# Altium integrated library Mastermind.IntLib: 985 symbols (part 2 of 6) (continued)
## F15HDH (continued)
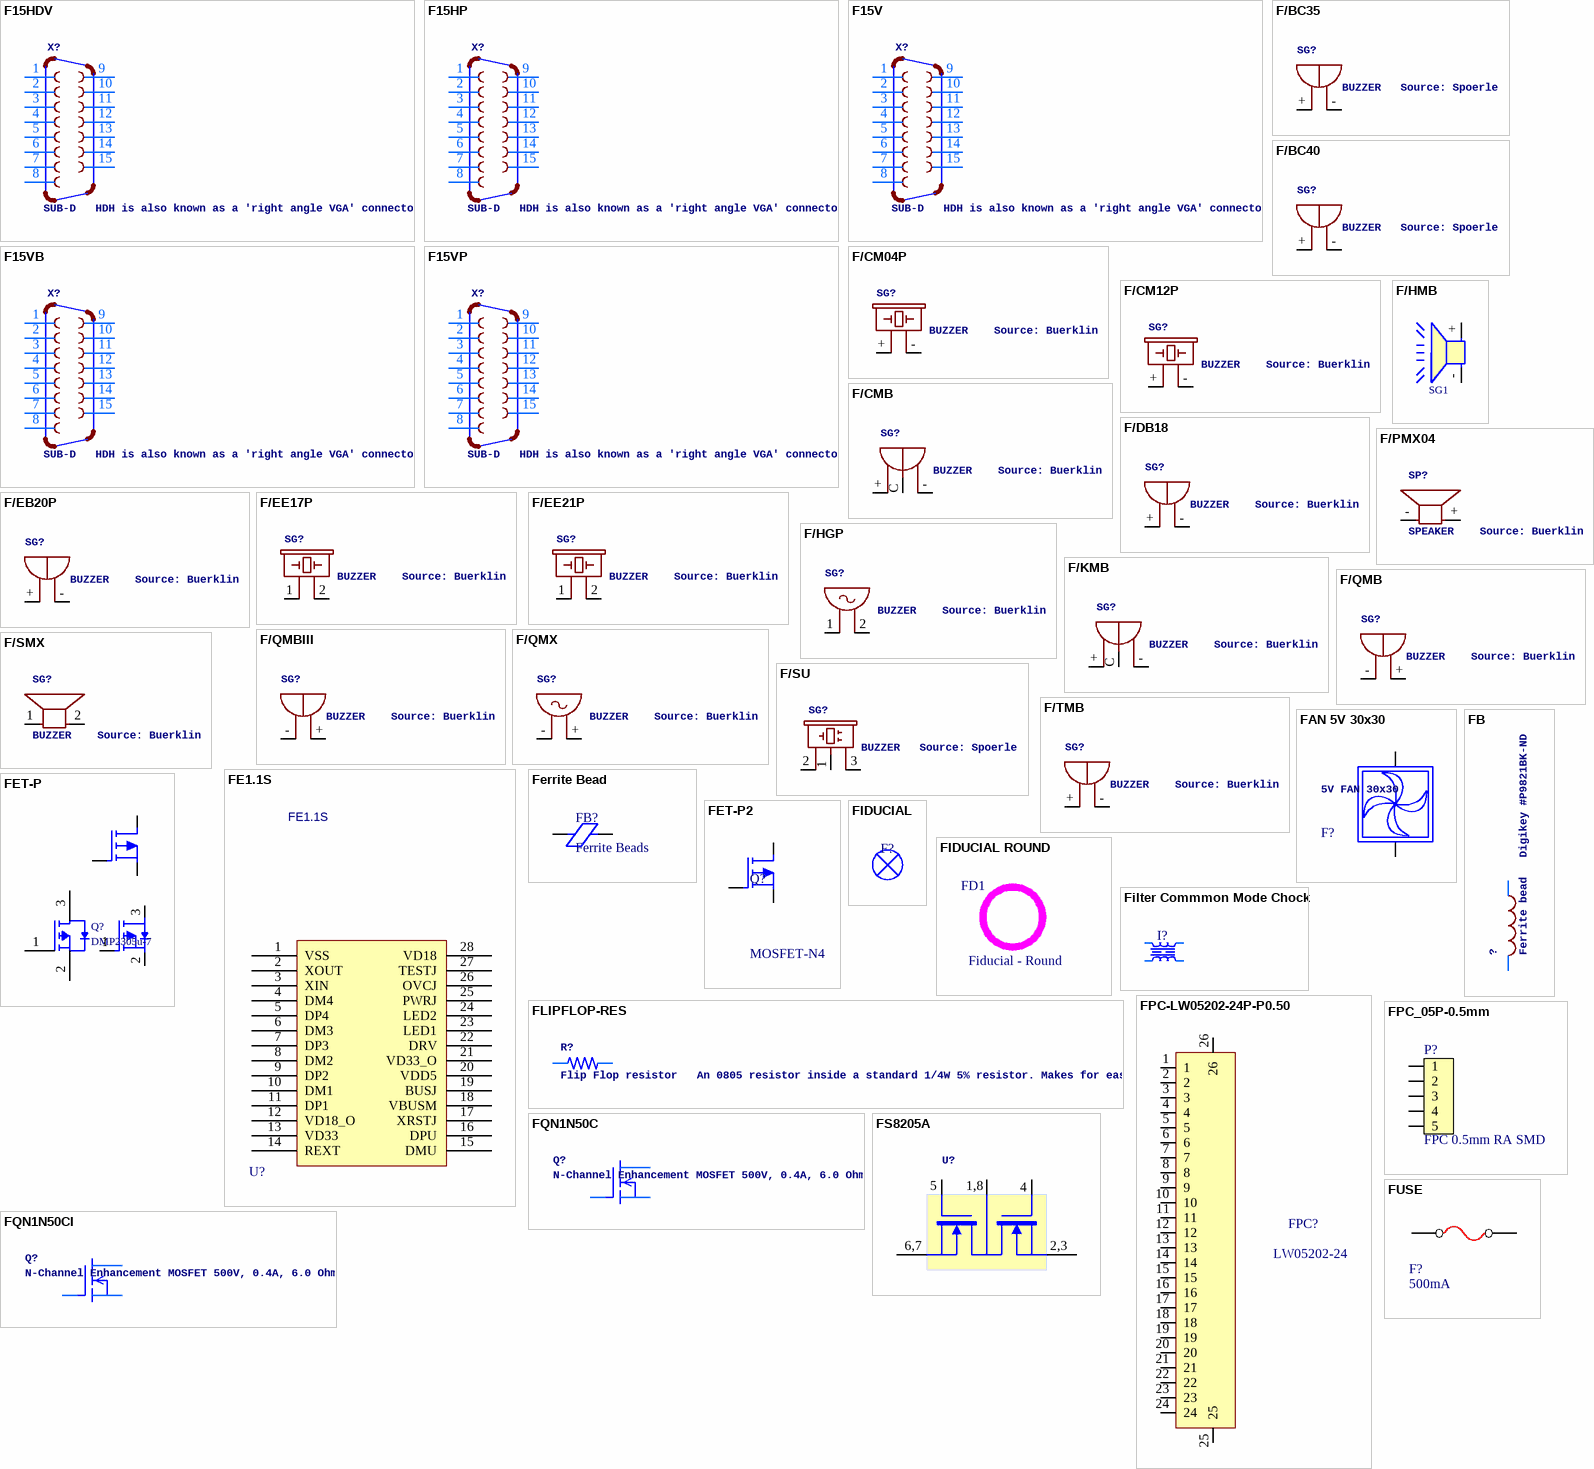
[diagram p12: symbols F15HDV to FUSE]

## F15HDV
designator X?, comment SUB-D   HDH is also known as a 'right angle VGA' connector
footprint HDF15V
pins: 1, 2, 3, 4, 5, 6, 7, 8, 9, 10, 11, 12, 13, 14, 15

## F15HP
designator X?, comment SUB-D   HDH is also known as a 'right angle VGA' connector
footprint F15HP
pins: 1, 2, 3, 4, 5, 6, 7, 8, 9, 10, 11, 12, 13, 14, 15

## F15V
designator X?, comment SUB-D   HDH is also known as a 'right angle VGA' connector
footprint F15V
pins: 1, 2, 3, 4, 5, 6, 7, 8, 9, 10, 11, 12, 13, 14, 15

## F15VB
designator X?, comment SUB-D   HDH is also known as a 'right angle VGA' connector
footprint F15VB
pins: 1, 2, 3, 4, 5, 6, 7, 8, 9, 10, 11, 12, 13, 14, 15

## F15VP
designator X?, comment SUB-D   HDH is also known as a 'right angle VGA' connector
footprint F15VP
pins: 1, 2, 3, 4, 5, 6, 7, 8, 9, 10, 11, 12, 13, 14, 15

## F/BC35
designator SG?, comment BUZZER   Source: Spoerle
OC_FARNELL: unknown; OC_NEWARK: unknown
footprint F/BC35
pins: +, -

## F/BC40
designator SG?, comment BUZZER   Source: Spoerle
OC_FARNELL: unknown; OC_NEWARK: unknown
footprint F/BC40
pins: +, -

## F/CM04P
designator SG?, comment BUZZER    Source: Buerklin
OC_FARNELL: unknown; OC_NEWARK: unknown
footprint F/CM04P
pins: + 1, - 2

## F/CM12P
designator SG?, comment BUZZER    Source: Buerklin
OC_FARNELL: unknown; OC_NEWARK: unknown
footprint F/CM12P
pins: + 1, - 2

## F/CMB
designator SG?, comment BUZZER    Source: Buerklin
OC_FARNELL: unknown; OC_NEWARK: unknown
footprint F/CMB
pins: +, -, C T

## F/DB18
designator SG?, comment BUZZER    Source: Buerklin
OC_FARNELL: unknown; OC_NEWARK: unknown
footprint F/DB18
pins: +, -

## F/EB20P
designator SG?, comment BUZZER    Source: Buerklin
OC_FARNELL: unknown; OC_NEWARK: unknown
footprint F/EB20P
pins: +, -

## F/EE17P
designator SG?, comment BUZZER    Source: Buerklin
OC_FARNELL: unknown; OC_NEWARK: unknown
footprint F/EE17P
pins: 1, 2

## F/EE21P
designator SG?, comment BUZZER    Source: Buerklin
OC_FARNELL: unknown; OC_NEWARK: unknown
footprint F/EE21P
pins: 1, 2

## F/HGP
designator SG?, comment BUZZER    Source: Buerklin
OC_FARNELL: unknown; OC_NEWARK: unknown
footprint F/HGP
pins: 1, 2

## F/HMB
designator SG1, comment YHE12-05ST  (value not drawn)
BUZZER; OC_FARNELL: unknown; OC_NEWARK: unknown
footprint F/HMB
pins: + 2, - 1

## F/KMB
designator SG?, comment BUZZER    Source: Buerklin
OC_FARNELL: unknown; OC_NEWARK: unknown
footprint F/KMB
pins: +, -, C T

## F/PMX04
designator SP?, comment SPEAKER    Source: Buerklin
OC_FARNELL: unknown; OC_NEWARK: unknown
footprint F/PMX04A
pins: + 2, - 1

## F/QMB
designator SG?, comment BUZZER    Source: Buerklin
OC_FARNELL: unknown; OC_NEWARK: unknown
footprint F/QMB
pins: + -, - +

## F/QMBIII
designator SG?, comment BUZZER    Source: Buerklin
OC_FARNELL: unknown; OC_NEWARK: unknown
footprint F/QMBIII
pins: + -, - +

## F/QMX
designator SG?, comment BUZZER    Source: Buerklin
OC_FARNELL: unknown; OC_NEWARK: unknown
footprint F/QMX
pins: + 2, - 1

## F/SMX
designator SG?, comment BUZZER    Source: Buerklin
OC_FARNELL: unknown; OC_NEWARK: unknown
footprint F/SMX
pins: 1, 2

## F/SU
designator SG?, comment BUZZER   Source: Spoerle
OC_FARNELL: unknown; OC_NEWARK: unknown
footprint F/SU
pins: 1, 2, 3

## F/TMB
designator SG?, comment BUZZER    Source: Buerklin
OC_FARNELL: unknown; OC_NEWARK: unknown
footprint F/TMB
pins: +, -

## FAN 5V 30x30
designator F?, comment 5V FAN 30x30
RaspberryPi Fan 5V 30x30
footprint JST-2-PTH-THM - VERTICAL
pins: 1, 2

## FB
designator ?, comment Ferrite bead   Digikey #P9821BK-ND
footprint FB
pins: P$1 1, P$2 2

## FE1.1S
designator U?
USB HUB 2.0, 4 Channel; Manufacturer: TERMINUS; Manufacturer Part: FE1.1S-BSOP28BCN; Supplier: LCSC; Supplier Part: C9359; JLCPCB Part Class: Extended Part; link: https://lcsc.com/eda_search?q=C9359&%26type=1&ref=editor; spicePre: U; spiceSymbolName: FE1.1S
footprint SSOP-28_L9.9-W3.9-P0.64-LS6.0-BL-1
pins: 1 VSS, 2 XOUT, 3 XIN, 4 DM4, 5 DP4, 6 DM3, 7 DP3, 8 DM2, 9 DP2, 10 DM1, 11 DP1, 12 VD18_O, 13 VD33, 14 REXT, 15 DMU, 16 DPU, 17 XRSTJ, 18 VBUSM, 19 BUSJ, 20 VDD5, 21 VD33_O, 22 DRV, 23 LED1, 24 LED2, 25 PWRJ, 26 OVCJ, 27 TESTJ, 28 VD18

## Ferrite Bead
designator FB?, comment Ferrite Beads
footprint INDC-0805
footprint INDC1005X04L
footprint INDC1608X06L
footprint INDC-0603
footprint INDC-0402
footprint INDC-0805-NO
pins: 1, 2

## FET-P
designator Q?, comment DMP2305u-7
P Channel Mosfet
pins: 1 "Gate", 1 G, 1 G, 2 "Source", 2 S, 2 D, 3 "Drain", 3 D, 4 S

## FET-P2
designator Q?, comment MOSFET-N4
N-Channel MOSFET, Externally Terminated Substrate; Published: 24-Mar-1999; LatestRevisionDate: 29-May-2009; LatestRevisionNote: IPC-7351 Footprint Added.; PackageVersion: Sep-2000; PackageReference: SOT-343; Publisher: Altium Limited; PackageDescription: 4-Pin SOT-343 Package 1.3 mm Pitch, 2.1 mm Lead Span
footprint SOT-343_N (SOT343, 4-Leads, Body 2x1.3 mm, Pitch 1.3mm, Lead Span 2.1mm, IPC Medium Density)
footprint SOT-343_L (SOT343, 4-Leads, Body 2x1.3 mm, Pitch 1.3mm, Lead Span 2.1mm, IPC High Density)
footprint SOT-343_M (SOT343, 4-Leads, Body 2x1.3 mm, Pitch 1.3mm, Lead Span 2.1mm, IPC Low Density)
simulation model NMOS (MOSFET-N)
pins: 1 G, 2 D, 4 S

## FIDUCIAL
designator F?, comment For use by pick and place machines to calibrate the vision/machine, 1mm  (value not drawn)
Fiducial Mark
footprint FIDUCIAL_1MM
footprint Fiducial

## FIDUCIAL ROUND
designator FD1, comment Fiducial - Round
Fiducial - Round 1.5mm Top-Bottom; Status: Unreleased; Category: Fiducial
footprint Fiducial

## Filter Commmon Mode Chock
designator I?  (value not drawn)
footprint filter
pins: 1, 2, 3 2, 4 3

## FLIPFLOP-RES
designator R?, comment Flip Flop resistor   An 0805 resistor inside a standard 1/4W 5% resistor. Makes for easy mods
footprint 0805-THM
pins: 1, 2

## FPC-LW05202-24P-P0.50
designator FPC?, comment LW05202-24
Manufacturer: MINTRON(明硕); Add into BOM: yes; Locking Feature: 抽屉式; Number of Contacts: 24P; Pitch: 0.5mm; FFC, FCB Thickness: 0.3mm; Symbol: LW05202-24; Device: LW05202-24; LCSC Part Name: 间距:0.5mm P数:24P 抽屉式 下接; Supplier Part: C375920; Manufacturer Part: LW05202-24; Supplier Footprint: SMD,P=0.5mm,卧贴; JLCPCB Part Class: Extended Part; Datasheet: https://atta.szlcsc.com/upload/public/pdf/source/20190322/C375926_97FD0B8889EE24B4FE9B3A29C1023ADE.pdf; Supplier: LCSC; Convert to PCB: yes; Contact Type: Bottom Contact; Mounting Type: 卧贴; Height Above Board: 2mm
footprint FPC-SMD_24P-P0.50_LW05202-24
3D model FPC-SMD_24P-P0.50_L17.6-W5.2-H2.0-LW05202-24
pins: 1, 2, 3, 4, 5, 6, 7, 8, 9, 10, 11, 12, 13, 14, 15, 16, 17, 18, 19, 20, 21, 22, 23, 24, 25, 26

## FPC_05P-0.5mm
designator P?, comment FPC 0.5mm RA SMD
0.5mm FPC, 5P,Right Angle SMT,Double Contact,H=1.2mm,White, Tin plated; Part Number: FPC_05P-0.5mm-RA-SMD; Manufacturer: W-CON; Manufacturer Part Number: 5141-05RZDNWR01; 2nd source part number: WM9836CT-ND; Artikkelnr Noca: 55010020; Artikkelnr Simpro: N.A.; Datasheet: \\hizz\pro\app9717\Datasheet\connectores\W-CON\5141-XXRZDNXX0X.pdf; Footprint Doc: FPC_05P-0.5mm-RA-SMD; LatestRevisionDate: 2016-04-21; Pin Count: 7; Publisher: Nordic Semiconductor; Published: 2015-06-22; Value: FPC 0.5mm RA SMD; Note: *; Supplier: Cabcon; Supplier part number: 5141-05RZDNWR01; 2nd source Supplier: Digi-Key
footprint FPC_05P-0.5mm-RA-SMD
pins: 1, 2, 3 (power), 4 (power), 5 (power)

## FQN1N50C
designator Q?, comment N-Channel Enhancement MOSFET 500V, 0.4A, 6.0 Ohm
footprint TO92
pins: 1 G, 2 D, 3 S

## FQN1N50CI
designator Q?, comment N-Channel Enhancement MOSFET 500V, 0.4A, 6.0 Ohm
footprint TO92-INLINE
pins: 1 D, 2 G, 3 S

## FS8205A
designator U?
footprint TSSOP-8
pins: 1 D12, 2 S1, 3 S1 (power), 4 G1 (power), 5 G2 (power), 6 S2, 7 S2, 8 D12
text: 1,8; 6,7; 2,3

## FUSE
designator F?  value 500mA
footprint 0411V
footprint FUSE
footprint FUSE - Long
footprint 0207/2V
footprint Fuse-SMD
footprint 1812
footprint R1206-NO
pins: 1, 2

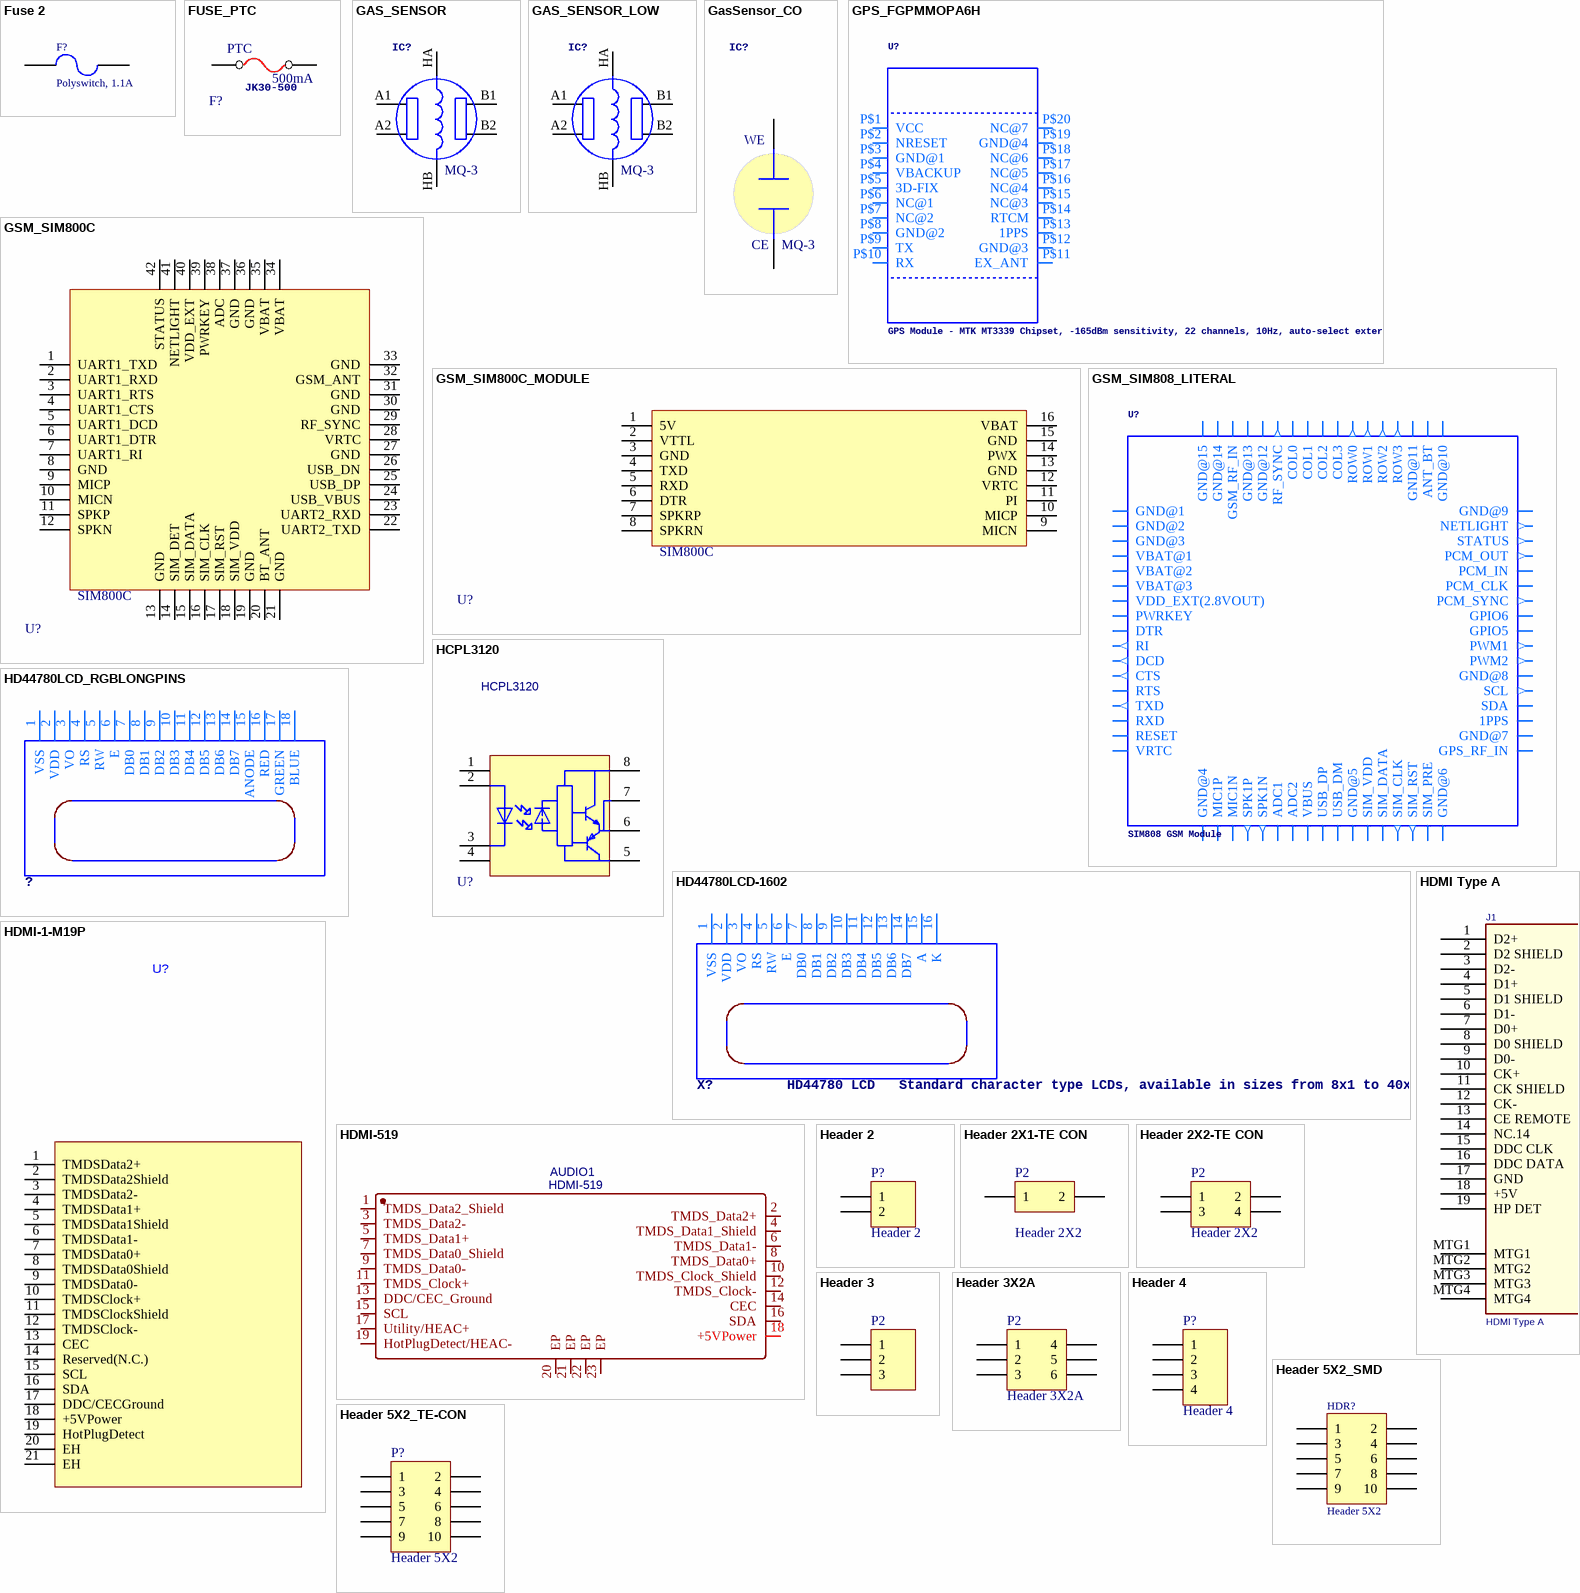
[diagram p13: symbols Fuse 2 to Header 5X2_TE-CON]

## Fuse 2
designator F?, comment Polyswitch, 1.1A
Polyswitch 1.1A, Raychem RUE110; Revision: July-2002: Re-released for DXP Platform.; Supplier: FARNELL; Supplier Code: 608-907
footprint PIN-W2/E2.8 (Fuse; 2 Leads)
simulation model FUSE (Spice Subcircuit)
footprint RUE160_0.2
3D model PolySwitch2 (PCB3D Model)
pins: 1, 2

## FUSE_PTC
designator F?, comment JK30-500  value 500mA
Resetable PTC fuse
footprint FUSE-TH_L14.0-W3.0-P10.20-D1.2-S1.2
pins: 1, 2
text: PTC

## GAS_SENSOR
designator IC?, comment TIMERChanged DIP package to have round (not oval) pin pads    http://www.ladyada.net/library/pcb/eaglelibrary.html  (value not drawn)
footprint MQ-3
pins: A1, A2, B1, B2, HA H1, HB H1 (power)
text: MQ-3

## GAS_SENSOR_LOW
designator IC?, comment TIMERChanged DIP package to have round (not oval) pin pads    http://www.ladyada.net/library/pcb/eaglelibrary.html  (value not drawn)
footprint MQ-7
pins: A1, A2, B1, B2, HA H1, HB H1 (power)
text: MQ-3

## GasSensor_CO
designator IC?, comment TIMERChanged DIP package to have round (not oval) pin pads    http://www.ladyada.net/library/pcb/eaglelibrary.html  (value not drawn)
footprint ME2
pins: C H1, W H1 (power)
text: WE; CE; MQ-3

## GPS_FGPMMOPA6H
designator U?, comment GPS Module - MTK MT3339 Chipset, -165dBm sensitivity, 22 channels, 10Hz, auto-select external antenna options
footprint FGPMMOPA6H
pins: P$1 VCC, P$2 NRESET, P$3 GND@1, P$4 VBACKUP, P$5 3D-FIX, P$6 NC@1, P$7 NC@2, P$8 GND@2, P$9 TX, P$10 RX, P$11 EX_ANT, P$12 GND@3, P$13 1PPS, P$14 RTCM, P$15 NC@3, P$16 NC@4, P$17 NC@5, P$18 NC@6, P$19 GND@4, P$20 NC@7

## GSM_SIM800C
designator U?, comment DeviceName: SIM800C  (hidden comment: SIM800C GSM/GPRS Module)
GateName_1: G$1; SymbolName_1: SIM900_LITERAL; DeviceSetName: GSM_SIM900_LITERAL; LibraryName: microbuilder; Package: SIM900_SMT; Parameter 1: *
footprint SIM800C
pins: 1 UART1_TXD, 2 UART1_RXD, 3 UART1_RTS, 4 UART1_CTS, 5 UART1_DCD, 6 UART1_DTR, 7 UART1_RI, 8 GND, 9 MICP, 10 MICN, 11 SPKP, 12 SPKN (power), 13 GND (power), 14 SIM_DET, 15 SIM_DATA, 16 SIM_CLK, 17 SIM_RST, 18 SIM_VDD, 19 GND, 20 BT_ANT, 21 GND, 22 UART2_TXD, 23 UART2_RXD, 24 USB_VBUS, 25 USB_DP, 26 USB_DN (power), 27 GND, 28 VRTC, 29 RF_SYNC, 30 GND, 31 GND, 32 GSM_ANT, 33 GND (power), 34 VBAT, 35 VBAT, 36 GND (power), 37 GND (power), 38 ADC (power), 39 PWRKEY (power), 40 VDD_EXT (power), 41 NETLIGHT (power), 42 STATUS

## GSM_SIM800C_MODULE
designator U?, comment DeviceName: SIM800C  (hidden comment: SIM800C GSM/GPRS Module)
GateName_1: G$1; SymbolName_1: SIM900_LITERAL; DeviceSetName: GSM_SIM900_LITERAL; LibraryName: microbuilder; Package: SIM900_SMT; Parameter 1: *
footprint SIM800C_Module
pins: 1 5V, 2 VTTL, 3 GND, 4 TXD, 5 RXD, 6 DTR, 7 SPKRP, 8 SPKRN, 9 MICN, 10 MICP, 11 PI, 12 VRTC (power), 13 GND (power), 14 PWX, 15 GND, 16 VBAT

## GSM_SIM808_LITERAL
designator U?, comment SIM808 GSM Module
footprint SIM900_SMT
pins: P$1 GND@1 (power), P$2 GND@2 (power), P$3 GND@3 (power), P$4 VBAT@1 (power), P$5 VBAT@2 (power), P$6 VBAT@3 (power), P$7 VDD_EXT(2.8VOUT) (power), P$8 PWRKEY, P$9 DTR, P$10 RI (out), P$11 DCD (out), P$12 CTS (out), P$13 RTS, P$14 TXD (out), P$15 RXD, P$16 RESET, P$17 VRTC (power), P$18 GND@4 (power), P$19 MIC1P, P$20 MIC1N, P$21 SPK1P (out), P$22 SPK1N (out), P$23 ADC1, P$24 ADC2, P$25 VBUS (power), P$26 USB_DP, P$27 USB_DM, P$28 GND@5 (power), P$29 SIM_VDD (power), P$30 SIM_DATA, P$31 SIM_CLK (out), P$32 SIM_RST (out), P$33 SIM_PRE, P$34 GND@6 (power), P$35 GPS_RF_IN, P$36 GND@7 (power), P$37 1PPS, P$38 SDA, P$39 SCL (out), P$40 GND@8 (power), P$41 PWM2 (out), P$42 PWM1 (out), P$43 GPIO5, P$44 GPIO6, P$45 PCM_SYNC (out), P$46 PCM_CLK, P$47 PCM_IN, P$48 PCM_OUT (out), P$49 STATUS (out), P$50 NETLIGHT (out), P$51 GND@9 (power), P$52 GND@10 (power), P$53 ANT_BT, P$54 GND@11 (power), P$55 ROW3 (out), P$56 ROW2 (out), P$57 ROW1 (out), P$58 ROW0 (out), P$59 COL3, P$60 COL2, P$61 COL1, P$62 COL0, P$63 RF_SYNC (out), P$64 GND@12 (power), P$65 GND@13 (power), P$66 GSM_RF_IN, P$67 GND@14 (power), P$68 GND@15 (power)

## HCPL3120
designator U?
Opto Gate Driver; Manufacturer: TOSHIBA; Manufacturer Part: TLP250(TP1,F); Supplier: LCSC; Supplier Part: C41664; spicePre: U; spiceSymbolName: TLP250(TP1,F)
footprint DIL08-ROUND
pins: 1, 2, 3, 4, 5 GND, 6, 7, 8 VCC

## HD44780LCD-1602
designator X?, comment HD44780 LCD   Standard character type LCDs, available in sizes from 8x1 to 40x4!
footprint LCD1602
pins: 1 VSS (oe), 2 VDD (oe), 3 VO, 4 RS, 5 RW, 6 E, 7 DB0, 8 DB1, 9 DB2, 10 DB3, 11 DB4, 12 DB5, 13 DB6, 14 DB7, 15 A, 16 K

## HD44780LCD_RGBLONGPINS
designator ?
footprint LCD1602-RGB
pins: 1 VSS (oe), 2 VDD (oe), 3 VO, 4 RS, 5 RW, 6 E, 7 DB0, 8 DB1, 9 DB2, 10 DB3, 11 DB4, 12 DB5, 13 DB6, 14 DB7, 15 ANODE, 16 RED, 17 GREEN, 18 BLUE

## HDMI Type A
designator J1
CONN RCPT 19POS HDMI RT ANG SMD; Manufacturer: Molex Connector Corporation; Manufacturer Part Number: 47151-0001; .Checked PCB: MM; Number of Positions: 19; Pitch: 0.50mm (.020"); Value: 47151-0001; Gender: Receptacle; .Version: V1.1 - Changed holes to slots; .Checked SCH: MM; Category: Connectors, Interconnects; Connector Type: HDMI; Family: USB, IEEE-1394 (Firewire), DVI, HDMI; Operating Temperature: -20°C to +85°C; Price 1k [$]: 1.74610; Supplier: Digikey; Supplier Part Number: WM19086CT-ND; Supplier 1: Digi-Key; Supplier Part Number 1: WM19086CT-ND; RoHS: RoHS Compliant; Stock 1: 2756; Pricing 1: 1=3.1, 10=2.57, 50=2.1456, 100=1.9034 (USD); Number of Contacts: 19; Specifications: -; Mounting Type: Surface Mount, Right Angle, Horizontal; Features: Detent Lock; Packaging: Cut Tape (CT); Ingress Protection: -; ComponentLink1URL: http://www.molex.com/pdm_docs/sd/471510001_sd.pdf; ComponentLink1Description: http://www.molex.com/pdm_docs/sd/471510001_sd.pdf
footprint HDMI Type-A
pins: 1 D2+, 2 D2 SHIELD, 3 D2-, 4 D1+, 5 D1 SHIELD, 6 D1-, 7 D0+, 8 D0 SHIELD, 9 D0-, 10 CK+, 11 CK SHIELD, 12 CK-, 13 CE REMOTE, 14 NC.14, 15 DDC CLK, 16 DDC DATA, 17 GND, 18 +5V, 19 HP DET, MTG1, MTG2, MTG3, MTG4

## HDMI-1-M19P
designator U?
footprint HDMI-SMD_BX-HDMI-1-M19P
pins: 1 TMDSData2+, 2 TMDSData2Shield, 3 TMDSData2-, 4 TMDSData1+, 5 TMDSData1Shield, 6 TMDSData1-, 7 TMDSData0+, 8 TMDSData0Shield, 9 TMDSData0-, 10 TMDSClock+, 11 TMDSClockShield, 12 TMDSClock-, 13 CEC, 14 Reserved(N.C.), 15 SCL, 16 SDA, 17 DDC/CECGround, 18 +5VPower, 19 HotPlugDetect, 20 EH, 21 EH

## HDMI-519
designator AUDIO1
Manufacturer: SOFNG(硕方); Contributor: LCSC; Supplier: LCSC; Supplier Part: C136421; Manufacturer Part: HDMI-519; JLCPCB Part Class: Extended Part; spicePre: A; spiceSymbolName: HDMI-519
footprint HDMI-SMD_19P-P0.40-H-F_HDMI-519
pins: 1 TMDS_Data2_Shield, 2 TMDS_Data2+, 3 TMDS_Data2-, 4 TMDS_Data1_Shield, 5 TMDS_Data1+, 6 TMDS_Data1-, 7 TMDS_Data0_Shield, 8 TMDS_Data0+, 9 TMDS_Data0-, 10 TMDS_Clock_Shield, 11 TMDS_Clock+, 12 TMDS_Clock-, 13 DDC/CEC_Ground, 14 CEC, 15 SCL, 16 SDA, 17 Utility/HEAC+, 18 +5VPower, 19 HotPlugDetect/HEAC-, 20 EP, 21 EP, 22 EP, 23 EP

## Header 2
designator P?
Header, 2-Pin; LatestRevisionDate: 17-Jul-2002; LatestRevisionNote: Re-released for DXP Platform.; Publisher: Altium Limited
footprint HDR1X2 (Connector; Header; 2 Position)
pins: 1, 2

## Header 2X1-TE CON
designator P2, comment Header 2X2
Header, 2-Pin, Dual row; LatestRevisionDate: 17-Jul-2002; LatestRevisionNote: Re-released for DXP Platform.; Publisher: Altium Limited
footprint HDR2X1-TE-CON (Connector; Header; 5x2 Position)
pins: 1, 2

## Header 2X2-TE CON
designator P2, comment Header 2X2
Header, 2-Pin, Dual row; LatestRevisionDate: 17-Jul-2002; LatestRevisionNote: Re-released for DXP Platform.; Publisher: Altium Limited
footprint HDR2X2-TE-CON (Connector; Header; 5x2 Position)
pins: 1, 2, 3, 4

## Header 3
designator P2  (value not drawn)
Header, 3-Pin; LatestRevisionDate: 17-Jul-2002; LatestRevisionNote: Re-released for DXP Platform.; Publisher: Altium Limited
footprint HDR1X3 (Connector; Header; 3 Position)
signal-integrity model Connector
footprint HDR1X3 - JUMP (Connector; Header; 3 Position)
pins: 1, 2, 3

## Header 3X2A
designator P2
Header, 3-Pin, Dual row; LatestRevisionDate: 17-Jul-2002; LatestRevisionNote: Re-released for DXP Platform.; Publisher: Altium Limited
signal-integrity model Connector
footprint HDR_2x3-SMD - 2.0
footprint HDR_2x3-SMD-2.54
footprint HDR2X3_1MM (Connector; Header; 3x2 Position)
pins: 1, 2, 3, 4, 5, 6

## Header 4
designator P?
Header, 4-Pin; LatestRevisionDate: 17-Jul-2002; LatestRevisionNote: Re-released for DXP Platform.; Publisher: Altium Limited
footprint JST-PH-4-THM
footprint 4PIN_SMD
footprint HDR1X4 (Connector; Header; 4 Position)
footprint HDR1X4 - 2mm (Connector; Header; 4 Position)
pins: 1, 2, 3, 4

## Header 5X2_SMD
designator HDR?, comment Header 5X2
Header, 5-Pin, Dual row; Revision: 17-Jul-2002: Re-released for DXP Platform.
footprint HDR2X5_LP
signal-integrity model Connector
3D model 10_pin_box_male (PCB3D Model)
footprint DIP10_2SIDED
footprint IDC10_2SIDED
pins: 1, 2, 3, 4, 5, 6, 7, 8, 9, 10

## Header 5X2_TE-CON
designator P?, comment Header 5X2
Header, 5-Pin, Dual row TE  Connectivity; LatestRevisionDate: 17-Jul-2002; LatestRevisionNote: Re-released for DXP Platform.; Publisher: Altium Limited
footprint HDR2X5 (Connector; Header; 5x2 Position)
signal-integrity model Connector
pins: 1, 2, 3, 4, 5, 6, 7, 8, 9, 10
